# Altium footprint library Inductors.PcbLib: 11 footprints
Each footprint in its own frame and in the unit in brackets; x right, y up, seen from the top. Pads: shape width x height; smd on the part's side, far side on the other; paste and mask are expansions set on the pad; w line width, h text height; cw(c..) or ccw(c..) is an arc to the next point about the centre after c.
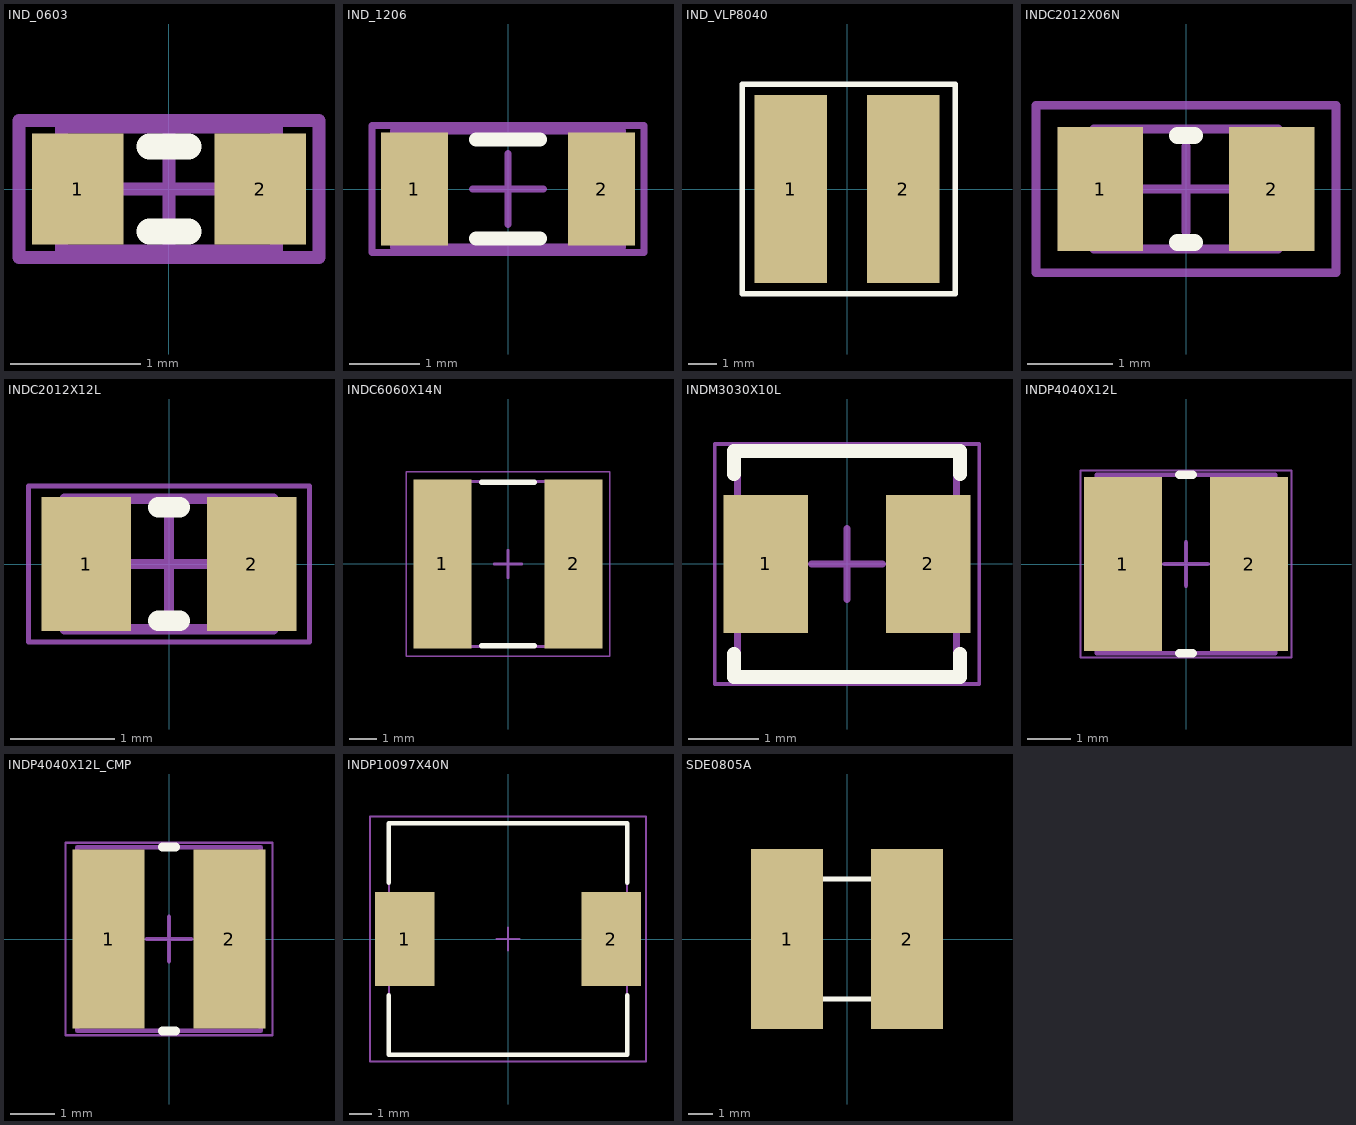
[diagram p0: the footprints below, top view; thin cyan lines are the x and y axes]

## IND_0603 [mm]
pads (2):
  rect 0.7x0.85 smd: 1(-0.7,0) 2(0.7,0)
Top Overlay:
  lines w0.2: -0.15,-0.325 0.15,-0.325 ; -0.15,0.325 0.15,0.325
Mechanical 13:
  lines w0.1: -0.825,-0.475 -0.825,0.475 0.825,0.475 0.825,-0.475 -0.825,-0.475
Mechanical 15:
  lines w0.1: -0.475,0 0.475,0 ; 0,-0.475 0,0.475 ; -1.15,-0.525 -1.15,0.525 1.15,0.525 1.15,-0.525 -1.15,-0.525
3D body "User Library-Chip Inductor.step": height 0.95, standoff 0, extent -0.738,-0.4 0.862,0.4

## IND_1206 [mm] "Chip Inductor, 2-Leads, Body 3,1x1,6mm, IPC High Density"
height 1.6
pads (2):
  rect 0.95x1.6 smd: 1(-1.325,0) 2(1.325,0)
Top Overlay:
  lines w0.2: -0.45,-0.7 0.45,-0.7 ; -0.45,0.7 0.45,0.7
Mechanical 13:
  lines w0.1: -1.625,-0.825 1.625,-0.825 1.625,0.825 -1.625,0.825 -1.625,-0.825
Mechanical 15:
  lines w0.1: -0.5,0 0.5,0 ; 0,-0.5 0,0.5 ; -1.925,-0.9 1.925,-0.9 1.925,0.9 -1.925,0.9 -1.925,-0.9
3D body "User Library-cap_1206-1.STEP": height 1.6, standoff 0, extent -1.625,-0.825 1.575,0.775

## IND_VLP8040 [mm]
pads (2):
  rect 2.55x6.6 smd: 1(-1.975,0) 2(1.975,0)
Top Overlay:
  lines w0.2: -3.683,-3.683 -3.683,-1.995 -3.683,2.119 -3.683,3.683 3.81,3.683 3.81,-3.683 -3.683,-3.683
3D body "User Library-VLP8040T.step": height 3.8, standoff -0.7, extent -3,-3.048 3,2.952

## INDC2012X06N [mm] "Chip Inductor 2-Leads, Body 2,0x1,3mm, IPC Medium Density"
height 0.6
pads (2):
  rect 1x1.45 smd: 1(-1,0) 2(1,0)
Top Overlay:
  lines w0.2: -0.1,-0.625 0.1,-0.625 ; -0.1,0.625 0.1,0.625
Mechanical 13:
  lines w0.1: -1.075,-0.7 -1.075,0.7 1.075,0.7 1.075,-0.7 -1.075,-0.7
Mechanical 15:
  lines w0.1: -0.5,0 0.5,0 ; 0,-0.5 0,0.5 ; -1.75,-0.975 -1.75,0.975 1.75,0.975 1.75,-0.975 -1.75,-0.975
3D body "SW3dPS-0805 SMD Capacitor.STEP": height 0.78, standoff 0, extent -1,-0.635 1,0.615

## INDC2012X12L [mm] "Chip Inductor, 2-Leads, Body 2.00x1.25mm, IPC High Density"
height 1.25
pads (2):
  rect 0.86x1.29 smd: 1(-0.795,0) 2(0.795,0)
Top Overlay:
  lines w0.2: -0.1,-0.545 0.1,-0.545 ; -0.1,0.545 0.1,0.545
Mechanical 13:
  lines w0.1: -1,-0.625 1,-0.625 1,0.625 -1,0.625 -1,-0.625
Mechanical 15:
  lines w0.05: -1.35,-0.75 1.35,-0.75 1.35,0.75 -1.35,0.75 -1.35,-0.75
  lines w0.1: -0.5,0 0.5,0 ; 0,-0.5 0,0.5
3D body: height 1.25, standoff 0, extent 0.55,-0.625 1,0.625
3D body: height 1.25, standoff 0, extent -1,-0.625 -0.55,0.625
3D body: height 1.25, standoff 0, extent -0.55,-0.625 0.55,0.625

## INDC6060X14N [mm] "Chip Inductor, 2-Leads, Body 6.00x6.00mm, IPC Medium Density"
height 1.4
pads (2):
  rect 2.1x6.14 smd: 1(-2.38,0) 2(2.38,0)
Top Overlay:
  lines w0.2: -0.95,-2.97 0.95,-2.97 ; -0.95,2.97 0.95,2.97
Mechanical 13:
  lines w0.1: -3,-3 3,-3 3,3 -3,3 -3,-3
Mechanical 15:
  lines w0.05: -3.7,-3.35 3.7,-3.35 3.7,3.35 -3.7,3.35 -3.7,-3.35
  lines w0.1: -0.5,0 0.5,0 ; 0,-0.5 0,0.5
3D body "User Library-cdrh5d28.STEP": height 2.9, standoff -0.1, extent -3,-3.048 3,2.952

## INDM3030X10L [mm] "Molded Inductor, 2-Leads, Body 3.00x3.00mm, IPC High Density"
height 1
pads (2):
  rect 1.2x1.95 smd: 1(-1.15,0) 2(1.15,0)
Top Overlay:
  lines w0.2: -1.6,-1.275 -1.6,-1.6 1.6,-1.6 1.6,-1.275 ; -1.6,1.275 -1.6,1.6 1.6,1.6 1.6,1.275
Mechanical 13:
  lines w0.1: -1.55,-1.55 -1.55,1.55 1.55,1.55 1.55,-1.55 -1.55,-1.55
Mechanical 15:
  lines w0.05: -1.875,-1.7 -1.875,1.7 1.875,1.7 1.875,-1.7 -1.875,-1.7
  lines w0.1: -0.5,0 0.5,0 ; 0,-0.5 0,0.5
3D body "srn3010.stp": height 1, standoff 0, extent -1.501,-1.5 1.501,1.5

## INDP4040X12L [mm] "Precision Wire Wound Inductor, 2-Leads, Body 4.00x4.00mm, IPC High Density"
height 1.2
pads (2):
  rect 1.8x4 smd: 1(-1.45,0) 2(1.45,0)
Top Overlay:
  lines w0.2: -0.15,-2.05 0.15,-2.05 ; -0.15,2.05 0.15,2.05
Mechanical 13:
  lines w0.1: -2.05,-2.05 -2.05,2.05 2.05,2.05 2.05,-2.05 -2.05,-2.05
Mechanical 15:
  lines w0.05: -2.425,-2.15 -2.425,2.15 2.425,2.15 2.425,-2.15 -2.425,-2.15
  lines w0.1: -0.5,0 0.5,0 ; 0,-0.5 0,0.5
3D body "User Library-nr3015.STEP": height 1.35, standoff -0.15, extent -2,-2 2,2

## INDP4040X12L_CMP [mm] "Precision Wire Wound Inductor, 2-Leads, Body 4.00x4.00mm, IPC Very High Density"
height 1.2
pads (2):
  rect 1.6x4 smd: 1(-1.35,0) 2(1.35,0)
Top Overlay:
  lines w0.2: -0.15,-2.05 0.15,-2.05 ; -0.15,2.05 0.15,2.05
Mechanical 13:
  lines w0.1: -2.05,-2.05 -2.05,2.05 2.05,2.05 2.05,-2.05 -2.05,-2.05
Mechanical 15:
  lines w0.05: -2.311,-2.15 -2.311,2.15 2.311,2.15 2.311,-2.15 -2.311,-2.15
  lines w0.1: -0.5,0 0.5,0 ; 0,-0.5 0,0.5
3D body "User Library-nr3015.STEP": height 1.35, standoff -0.15, extent -2,-2 2,2

## INDP10097X40N [mm] "Precision Wire Wound Inductor, 2-Leads, Body 10,0x9,7mm, IPC Medium Density"
height 4
pads (2):
  rect 2.6x4.1 smd: 1(-4.5,0) 2(4.5,0)
Top Overlay:
  lines w0.2: -5.2,-2.45 -5.2,-5.05 5.2,-5.05 5.2,-2.45 ; -5.2,2.45 -5.2,5.05 5.2,5.05 5.2,2.45
Mechanical 13:
  lines w0.1: -5.2,-5.05 -5.2,5.05 5.2,5.05 5.2,-5.05 -5.2,-5.05
Mechanical 15:
  lines w0.1: -0.5,0 0.5,0 ; 0,-0.5 0,0.5 ; -6.025,-5.35 -6.025,5.35 6.025,5.35 6.025,-5.35 -6.025,-5.35
3D body "Coilcraft-MSS1038-DEFAULT.STEP": height 3.9, standoff -0.1, extent -5.15,-5.05 5.15,5.15

## SDE0805A [mm]
pads (2):
  rect 3x7.5 smd: 1(-2.5,0) 2(2.5,0)
Top Overlay:
  lines w0.2: -2.75,-2.5 2.75,-2.5 2.75,2.5 -2.75,2.5 -2.75,0 -2.75,-2.5
3D body "SDE0805A.STP": height 5, standoff 0, extent -3.851,-3.52 3.801,3.48